# Altium footprint library aiskylab-01Resistors.PcbLib: 208 footprints (part 10 of 13)
Each footprint in its own frame and in the unit in brackets; x right, y up, seen from the top. Pads: shape width x height; smd on the part's side, far side on the other; paste and mask are expansions set on the pad; w line width, h text height; cw(c..) or ccw(c..) is an arc to the next point about the centre after c.
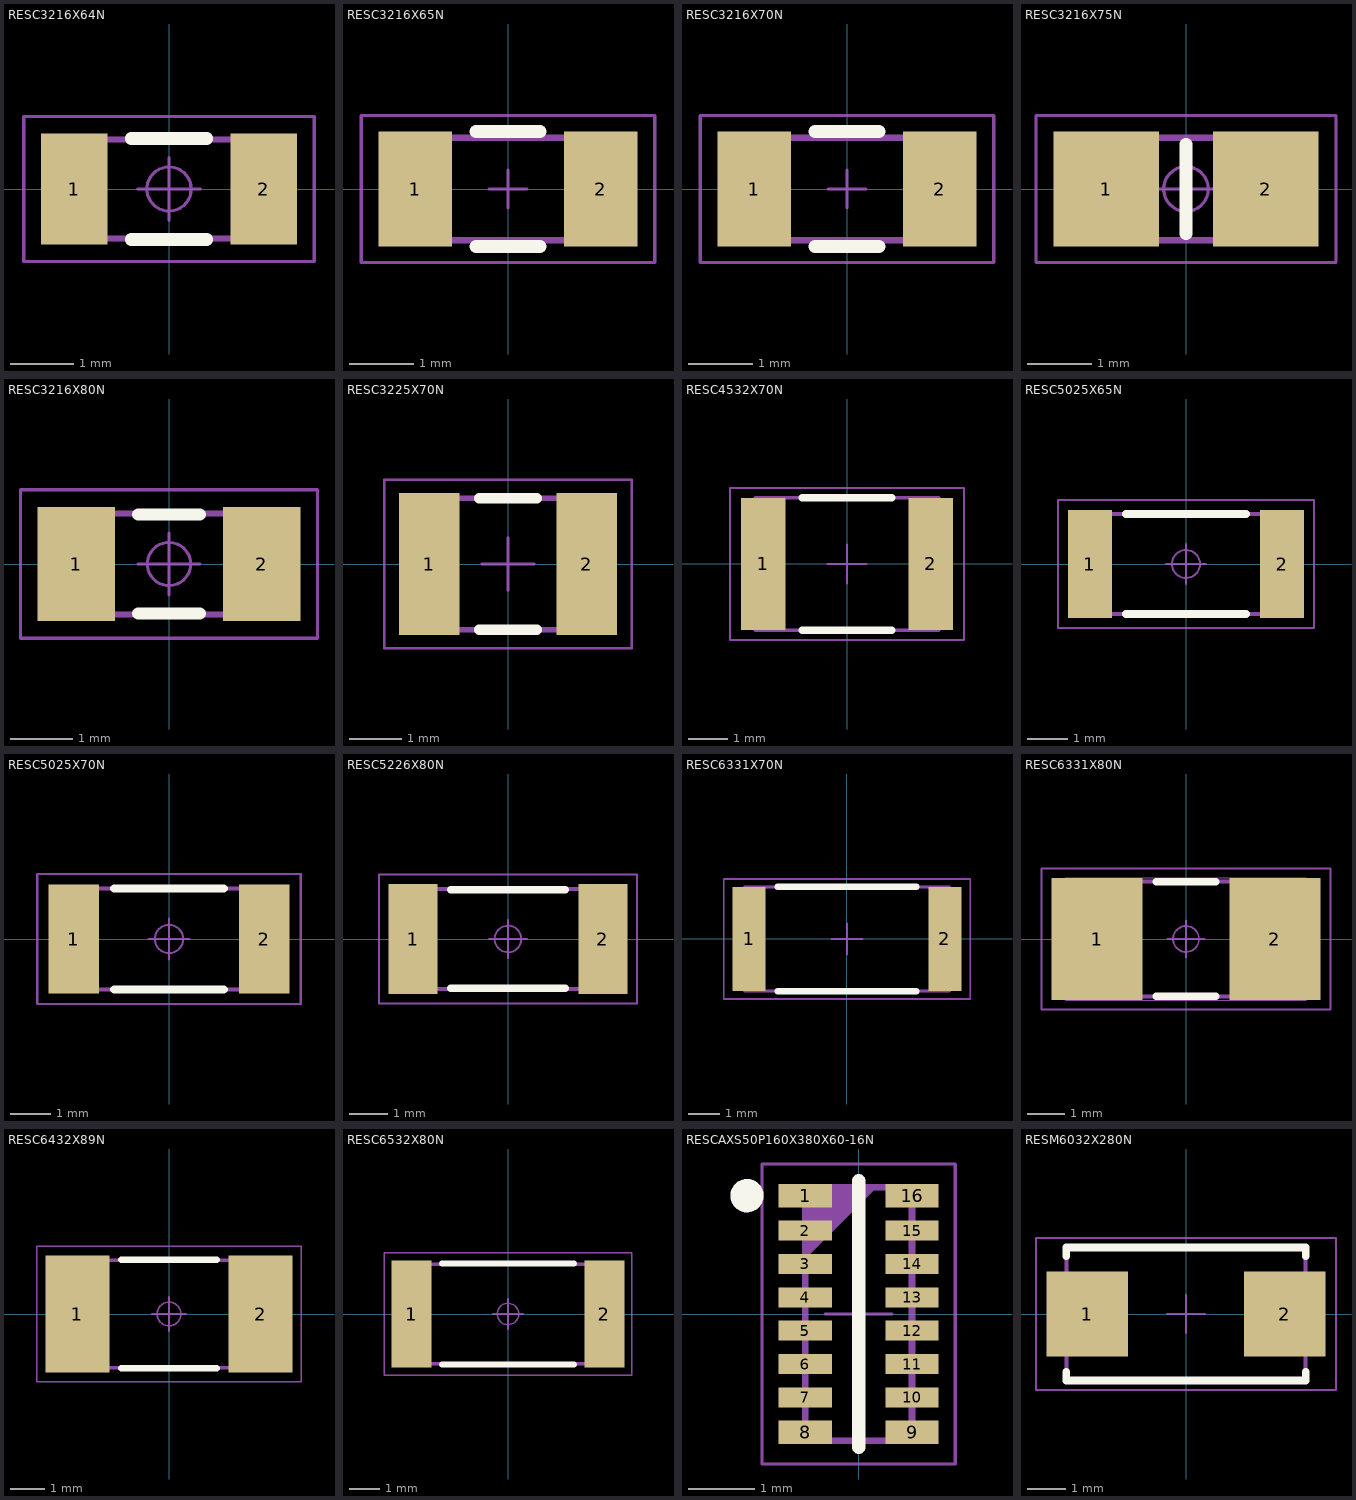
[diagram p9: the footprints below, top view; thin cyan lines are the x and y axes]

## RESC3216X64N [mm] "Chip Resistor, EIA 1206, Metric 3216, Body 3.2x1.6mm, IPC Medium Density"
height 0.64
pads (2):
  rect 1.05x1.75 smd: 1(-1.5,0) 2(1.5,0)
Top Overlay:
  lines w0.2: -0.6,-0.8 0.6,-0.8 ; -0.6,0.8 0.6,0.8
Top Designator:
  text ".Designator" at -7.618,-0.508 h1.52
Top Assembly:
  lines w0.1: -1.6,-0.785 -1.6,0.785 1.6,0.785 1.6,-0.785 -1.6,-0.785
Bottom 3D Body:
  circle w0.05: c0,0 r0.35
  lines w0.05: -0.5,0 0.5,0 ; 0,-0.5 0,0.5 ; -2.3,-1.15 -2.3,1.15 2.3,1.15 2.3,-1.15 -2.3,-1.15
3D body "p175-105.stp": height 0.02, standoff 0, extent -2.025,-0.875 -0.975,0.875
3D body "p175-105.stp": height 0.02, standoff 0, extent 0.975,-0.875 2.025,0.875
3D body "RESC3216X64N.stp": height 0.65, standoff 0, extent -1.675,-0.875 1.675,0.875

## RESC3216X65N [mm] "Chip Resistor, EIA 1206, Metric 3216, Body 3.2x1.6mm, IPC Medium Density"
height 0.65
pads (2):
  rect 1.15x1.8 smd: 1(-1.45,0) 2(1.45,0)
Top Overlay:
  lines w0.2: -0.5,-0.9 0.5,-0.9 ; -0.5,0.9 0.5,0.9
Top Designator:
  text ".Designator" at -7.618,-0.508 h1.52
Top Assembly:
  lines w0.1: -1.6,-0.8 -1.6,0.8 1.6,0.8 1.6,-0.8 -1.6,-0.8
Bottom 3D Body:
  lines w0.05: -0.3,0 0.3,0 ; 0,-0.3 0,0.3 ; -2.3,-1.15 -2.3,1.15 2.3,1.15 2.3,-1.15 -2.3,-1.15
3D body "p180-115.stp": height 0.02, standoff 0, extent -2.025,-0.9 -0.875,0.9
3D body "p180-115.stp": height 0.02, standoff 0, extent 0.875,-0.9 2.025,0.9
3D body "RESC3216X65N.stp": height 0.65, standoff 0, extent -1.675,-0.875 1.675,0.875

## RESC3216X70N [mm] "Chip Resistor, EIA 1206, Metric 3216, Body 3.2x1.6mm, IPC Medium Density"
height 0.7
pads (2):
  rect 1.15x1.8 smd: 1(-1.45,0) 2(1.45,0)
Top Overlay:
  lines w0.2: -0.5,-0.9 0.5,-0.9 ; -0.5,0.9 0.5,0.9
Top Designator:
  text ".Designator" at -7.618,-0.508 h1.52
Top Assembly:
  lines w0.1: -1.6,-0.8 -1.6,0.8 1.6,0.8 1.6,-0.8 -1.6,-0.8
Bottom 3D Body:
  lines w0.05: -0.3,0 0.3,0 ; 0,-0.3 0,0.3 ; -2.3,-1.15 -2.3,1.15 2.3,1.15 2.3,-1.15 -2.3,-1.15
3D body "p180-115.stp": height 0.02, standoff 0, extent -2.025,-0.9 -0.875,0.9
3D body "p180-115.stp": height 0.02, standoff 0, extent 0.875,-0.9 2.025,0.9
3D body "RESC3216X70N.stp": height 0.7, standoff 0, extent -1.7,-0.9 1.7,0.9

## RESC3216X75N [mm] "Chip Resistor, EIA 1206, Metric 3216, Body 3.2x1.6mm, IPC Medium Density"
height 0.75
pads (2):
  rect 1.65x1.8 smd: 1(-1.25,0) 2(1.25,0)
Top Overlay:
  lines w0.2: 0,-0.7 0,0.7
Top Designator:
  text ".Designator" at -7.618,-0.508 h1.52
Top Assembly:
  lines w0.1: -1.6,-0.8 -1.6,0.8 1.6,0.8 1.6,-0.8 -1.6,-0.8
Bottom 3D Body:
  circle w0.05: c0,0 r0.35
  lines w0.05: -0.5,0 0.5,0 ; 0,-0.5 0,0.5 ; -2.35,-1.15 -2.35,1.15 2.35,1.15 2.35,-1.15 -2.35,-1.15
3D body "p180-165.stp": height 0.02, standoff 0, extent 0.425,-0.9 2.075,0.9
3D body "p180-165.stp": height 0.02, standoff 0, extent -2.075,-0.9 -0.425,0.9
3D body "RESC3216X75N.stp": height 0.75, standoff 0, extent -1.675,-0.875 1.675,0.875

## RESC3216X80N [mm] "Chip Resistor, EIA 1206, Metric 3216, Body 3.2x1.6mm, IPC Medium Density"
height 0.8
pads (2):
  rect 1.25x1.85 smd: 1(-1.5,0) 2(1.5,0)
Top Overlay:
  lines w0.2: -0.5,-0.8 0.5,-0.8 ; -0.5,0.8 0.5,0.8
Top Designator:
  text ".Designator" at -7.618,-0.508 h1.52
Top Assembly:
  lines w0.1: -1.6,-0.815 -1.6,0.815 1.6,0.815 1.6,-0.815 -1.6,-0.815
Bottom 3D Body:
  circle w0.05: c0,0 r0.35
  lines w0.05: -0.5,0 0.5,0 ; 0,-0.5 0,0.5 ; -2.4,-1.2 2.4,-1.2 2.4,1.2 -2.4,1.2 -2.4,-1.2
3D body "p185-125.stp": height 0.02, standoff 0, extent 0.875,-0.925 2.125,0.925
3D body "p185-125.stp": height 0.02, standoff 0, extent -2.125,-0.925 -0.875,0.925
3D body "RESC3216X80N.stp": height 0.8, standoff 0, extent -1.675,-0.875 1.675,0.875

## RESC3225X70N [mm] "Chip Resistor, EIA 1210, Metric 3225, Body 3.2x2.5mm, IPC Medium Density"
height 0.7
pads (2):
  rect 1.15x2.7 smd: 1(-1.5,0) 2(1.5,0)
Top Overlay:
  lines w0.2: -0.55,-1.25 0.55,-1.25 ; -0.55,1.25 0.55,1.25
Top Designator:
  text ".Designator" at -7.618,-0.508 h1.52
Top Assembly:
  lines w0.1: -1.6,-1.25 -1.6,1.25 1.6,1.25 1.6,-1.25 -1.6,-1.25
Bottom 3D Body:
  lines w0.05: -0.5,0 0.5,0 ; 0,-0.5 0,0.5 ; -2.35,-1.6 -2.35,1.6 2.35,1.6 2.35,-1.6 -2.35,-1.6
3D body "p270-125.stp": height 0.02, standoff 0, extent 0.925,-1.35 2.075,1.35
3D body "p270-125.stp": height 0.02, standoff 0, extent -2.075,-1.35 -0.925,1.35
3D body "RESC3225X70N.stp": height 0.7, standoff 0, extent -1.7,-1.35 1.7,1.35

## RESC4532X70N [mm] "Chip Resistor, EIA 1812, Metric 4532, 2-Leads, Body 4.5x3.2mm, IPC Medium Density"
height 0.7
pads (2):
  rect 1.15x3.4 smd: 1(-2.15,0) 2(2.15,0)
Top Overlay:
  lines w0.2: -1.15,-1.7 1.15,-1.7 ; -1.15,1.7 1.15,1.7
Top Designator:
  text ".Designator" at -7.618,-0.508 h1.52
Top Assembly:
  lines w0.1: -2.35,-1.7 -2.35,1.7 2.35,1.7 2.35,-1.7 -2.35,-1.7
Bottom 3D Body:
  lines w0.05: -0.5,0 0.5,0 ; 0,-0.5 0,0.5 ; -3,-1.95 3,-1.95 3,1.95 -3,1.95 -3,-1.95
3D body "p340-115.stp": height 0.02, standoff 0, extent -2.725,-1.7 -1.575,1.7
3D body "p340-115.stp": height 0.02, standoff 0, extent 1.575,-1.7 2.725,1.7
3D body "RESC4532X70N.stp": height 0.7, standoff 0, extent -2.35,-1.7 2.35,1.7

## RESC5025X65N [mm] "Resistor, Chip; 5mm L X 2.5mm W X 0.65mm H, IPC Medium Density"
height 0.65
pads (2):
  rect 1.1x2.7 smd: 1(-2.4,0) 2(2.4,0)
Top Overlay:
  lines w0.2: -1.5,-1.25 1.5,-1.25 ; -1.5,1.25 1.5,1.25
Top Designator:
  text ".Designator" at -7.618,-0.508 h1.52
Top Assembly:
  lines w0.1: -2.5,-1.25 -2.5,1.25 2.5,1.25 2.5,-1.25 -2.5,-1.25
Bottom 3D Body:
  circle w0.05: c0,0 r0.35
  lines w0.05: -0.5,0 0.5,0 ; 0,-0.5 0,0.5 ; -3.2,-1.6 3.2,-1.6 3.2,1.6 -3.2,1.6 -3.2,-1.6
3D body "p270-110.stp": height 0.02, standoff 0, extent -2.95,-1.35 -1.85,1.35
3D body "p270-110.stp": height 0.02, standoff 0, extent 1.85,-1.35 2.95,1.35
3D body "RESC5025X65N.stp": height 0.65, standoff 0, extent -2.55,-1.325 2.55,1.325

## RESC5025X70N [mm] "Resistor, Chip; EIA 2010, Metric 5025, 5.00mm L X 2.50mm W X 0.70mm H, IPC Medium Density"
height 0.7
pads (2):
  rect 1.25x2.7 smd: 1(-2.35,0) 2(2.35,0)
Top Overlay:
  lines w0.2: -1.35,-1.25 1.35,-1.25 ; -1.35,1.25 1.35,1.25
Top Designator:
  text ".Designator" at -7.618,-0.508 h1.52
Top Assembly:
  lines w0.1: -2.5,-1.25 -2.5,1.25 2.5,1.25 2.5,-1.25 -2.5,-1.25
Bottom 3D Body:
  circle w0.05: c0,0 r0.35
  lines w0.05: -0.5,0 0.5,0 ; 0,-0.5 0,0.5 ; -3.25,-1.6 -3.25,1.6 3.25,1.6 3.25,-1.6 -3.25,-1.6
3D body "p270-125.stp": height 0.02, standoff 0, extent -2.975,-1.35 -1.725,1.35
3D body "p270-125.stp": height 0.02, standoff 0, extent 1.725,-1.35 2.975,1.35
3D body "RESC5025X70N.stp": height 0.7, standoff 0, extent -2.5,-1.25 2.5,1.25

## RESC5226X80N [mm] "Resistor, Chip; 5.23mm L X 2.64mm W X 0.80mm H IPC Medium Density"
height 0.8
pads (2):
  rect 1.3x2.9 smd: 1(-2.5,0) 2(2.5,0)
Top Overlay:
  lines w0.2: -1.5,-1.3 1.5,-1.3 ; -1.5,1.3 1.5,1.3
Top Designator:
  text ".Designator" at -7.618,-0.508 h1.52
Top Assembly:
  lines w0.1: -2.615,-1.32 -2.615,1.32 2.615,1.32 2.615,-1.32 -2.615,-1.32
Bottom 3D Body:
  circle w0.05: c0,0 r0.35
  lines w0.05: -0.5,0 0.5,0 ; 0,-0.5 0,0.5 ; -3.4,-1.7 3.4,-1.7 3.4,1.7 -3.4,1.7 -3.4,-1.7
3D body "p290-130.stp": height 0.02, standoff 0, extent -3.15,-1.45 -1.85,1.45
3D body "p290-130.stp": height 0.02, standoff 0, extent 1.85,-1.45 3.15,1.45
3D body "RESC5226X80N.stp": height 0.8, standoff 0, extent -2.615,-1.32 2.615,1.32

## RESC6331X70N [mm] "Chip Resistor, EIA 2512, Metric 6331, 2-Leads, Body 6.3x3.1mm, IPC Medium Density"
height 0.7
pads (2):
  rect 1.05x3.3 smd: 1(-3.1,0) 2(3.1,0)
Top Overlay:
  lines w0.2: -2.2,-1.65 2.2,-1.65 ; -2.2,1.65 2.2,1.65
Top Designator:
  text ".Designator" at -7.618,-0.508 h1.52
Top Assembly:
  lines w0.1: -3.25,-1.65 -3.25,1.65 3.25,1.65 3.25,-1.65 -3.25,-1.65
Bottom 3D Body:
  lines w0.05: -0.5,0 0.5,0 ; 0,-0.5 0,0.5 ; -3.9,-1.9 -3.9,1.9 3.9,1.9 3.9,-1.9 -3.9,-1.9
3D body "p330-105.stp": height 0.02, standoff 0, extent -3.625,-1.65 -2.575,1.65
3D body "p330-105.stp": height 0.02, standoff 0, extent 2.575,-1.65 3.625,1.65
3D body "RESC6331X70N.stp": height 0.7, standoff 0, extent -3.25,-1.65 3.25,1.65

## RESC6331X80N [mm] "Chip Resistor, EIA 2512, Metric 6331, 2-Leads, Body 6.3x3.1mm, IPC Medium Density"
height 0.8
pads (2):
  rect 2.45x3.3 smd: 1(-2.4,0) 2(2.4,0)
Top Overlay:
  lines w0.2: -0.8,-1.55 0.8,-1.55 ; -0.8,1.55 0.8,1.55
Top Designator:
  text ".Designator" at -7.618,-0.508 h1.52
Top Assembly:
  lines w0.1: -3.15,-1.55 -3.15,1.55 3.15,1.55 3.15,-1.55 -3.15,-1.55
Top 3D Body:
  lines w0.001: -3.25,-1.65 -3.25,1.65 3.25,1.65 3.25,-1.65 -3.25,-1.65
Bottom 3D Body:
  circle w0.05: c0,0 r0.35
  lines w0.05: -0.5,0 0.5,0 ; 0,-0.5 0,0.5 ; -3.9,-1.9 3.9,-1.9 3.9,1.9 -3.9,1.9 -3.9,-1.9
3D body "p330-245.stp": height 0.02, standoff 0, extent -3.625,-1.65 -1.175,1.65
3D body "p330-245.stp": height 0.02, standoff 0, extent 1.175,-1.65 3.625,1.65
3D body "RESC6331X80N.stp": height 0.8, standoff 0, extent -3.25,-1.65 3.25,1.65

## RESC6432X89N [mm] "Resistor, Chip; 6.35mm L X 3.18mm W X 0.889mm H, IPC Medium Density"
height 0.89
pads (2):
  rect 1.9x3.45 smd: 1(-2.7,0) 2(2.7,0)
Top Overlay:
  lines w0.2: -1.4,-1.6 1.4,-1.6 ; -1.4,1.6 1.4,1.6
Top Designator:
  text ".Designator" at -7.618,-0.508 h1.52
Top 3D Body:
  lines w0.1: -3.175,-1.59 -3.175,1.59 3.175,1.59 3.175,-1.59 -3.175,-1.59
Bottom 3D Body:
  circle w0.05: c0,0 r0.35
  lines w0.05: -0.5,0 0.5,0 ; 0,-0.5 0,0.5 ; -3.9,-2 3.9,-2 3.9,2 -3.9,2 -3.9,-2
3D body "p345-190.stp": height 0.02, standoff 0, extent -3.65,-1.725 -1.75,1.725
3D body "p345-190.stp": height 0.02, standoff 0, extent 1.75,-1.725 3.65,1.725
3D body "RESC6432X89N.stp": height 0.89, standoff 0, extent -3.3,-1.715 3.3,1.715

## RESC6532X80N [mm] "Resistor, Chip; 6.5mm L X 3.25mm W X 0.80mm H, IPC Medium Density"
height 0.8
pads (2):
  rect 1.3x3.5 smd: 1(-3.15,0) 2(3.15,0)
Top Overlay:
  lines w0.2: -2.15,-1.65 2.15,-1.65 ; -2.15,1.65 2.15,1.65
Top Designator:
  text ".Designator" at -7.618,-0.508 h1.52
Top Assembly:
  lines w0.1: -3.25,-1.625 -3.25,1.625 3.25,1.625 3.25,-1.625 -3.25,-1.625
Bottom 3D Body:
  circle w0.05: c0,0 r0.35
  lines w0.05: -0.5,0 0.5,0 ; 0,-0.5 0,0.5 ; -4.05,-2 -4.05,2 4.05,2 4.05,-2 -4.05,-2
3D body "p350-130.stp": height 0.02, standoff 0, extent -3.8,-1.75 -2.5,1.75
3D body "p350-130.stp": height 0.02, standoff 0, extent 2.5,-1.75 3.8,1.75
3D body "RESC6532X80N.stp": height 0.8, standoff 0, extent -3.25,-1.625 3.25,1.625

## RESCAXS50P160X380X60-16N [mm] "Resistor, Chip Array, 0.50mm pitch; 16 pin, 1.60mm W X 3.80mm L X 0.60mm H, IPC Medium Density"
height 0.6
pads (16):
  rect 0.8x0.35 smd: 1(-0.8,1.775) 8(-0.8,-1.775) 9(0.8,-1.775) 16(0.8,1.775)
  rect 0.8x0.3 smd: 2(-0.8,1.25) 3(-0.8,0.75) 4(-0.8,0.25) 5(-0.8,-0.25) 6(-0.8,-0.75) 7(-0.8,-1.25) 10(0.8,-1.25) 11(0.8,-0.75) 12(0.8,-0.25) 13(0.8,0.25) 14(0.8,0.75) 15(0.8,1.25)
Top Overlay:
  circle w0.25: c-1.675,1.775 r0.125
  lines w0.2: 0,-2 0,2
Top Designator:
  text ".Designator" at -7.843,-0.508 h1.52
Top Assembly:
  lines w0.1: -0.8,-1.9 -0.8,1.9 0.8,1.9 0.8,-1.9 -0.8,-1.9 ; -0.8,0.9 0.2,1.9 -0.8,0.9 ; -0.8,1 0.1,1.9 -0.8,1 ; -0.8,1.1 0,1.9 -0.8,1.1 ; -0.8,1.2 -0.1,1.9 -0.8,1.2 ; -0.8,1.3 -0.2,1.9 -0.8,1.3 ; -0.8,1.4 -0.3,1.9 -0.8,1.4 ; -0.8,1.5 -0.4,1.9 -0.8,1.5 ; -0.8,1.6 -0.5,1.9 -0.8,1.6 ; -0.8,1.7 -0.6,1.9 -0.8,1.7 ; -0.8,1.8 -0.7,1.9 -0.8,1.8
Bottom 3D Body:
  lines w0.05: -0.5,0 0.5,0 ; 0,-0.5 0,0.5 ; -1.45,-2.25 1.45,-2.25 1.45,2.25 -1.45,2.25 -1.45,-2.25
3D body "p080-030.stp": height 0.02, standoff 0, extent -1.2,-0.425 -0.4,-0.075
3D body "p080-030.stp": height 0.02, standoff 0, extent -1.2,-0.925 -0.4,-0.575
3D body "p080-030.stp": height 0.02, standoff 0, extent -1.2,-1.425 -0.4,-1.075
3D body "p080-030.stp": height 0.02, standoff 0, extent -1.2,-1.95 -0.4,-1.6
3D body "p080-030.stp": height 0.02, standoff 0, extent -1.2,1.6 -0.4,1.95
3D body "p080-030.stp": height 0.02, standoff 0, extent -1.2,1.075 -0.4,1.425
3D body "p080-030.stp": height 0.02, standoff 0, extent -1.2,0.575 -0.4,0.925
3D body "p080-030.stp": height 0.02, standoff 0, extent -1.2,0.075 -0.4,0.425
3D body "p080-030.stp": height 0.02, standoff 0, extent 0.4,-1.95 1.2,-1.6
3D body "p080-030.stp": height 0.02, standoff 0, extent 0.4,-1.425 1.2,-1.075
3D body "p080-030.stp": height 0.02, standoff 0, extent 0.4,-0.925 1.2,-0.575
3D body "p080-030.stp": height 0.02, standoff 0, extent 0.4,-0.425 1.2,-0.075
3D body "p080-030.stp": height 0.02, standoff 0, extent 0.4,0.075 1.2,0.425
3D body "p080-030.stp": height 0.02, standoff 0, extent 0.4,0.575 1.2,0.925
3D body "p080-030.stp": height 0.02, standoff 0, extent 0.4,1.075 1.2,1.425
3D body "p080-030.stp": height 0.02, standoff 0, extent 0.4,1.6 1.2,1.95
3D body "RESCAXS50P160X380X60-16N.stp": height 0.6, standoff 0, extent -0.9,-2 0.9,2

## RESM6032X280N [mm] "Molded Chip Resistor, 2-Leads, Body 6x3.2mm, IPC Medium Density"
height 2.8
pads (2):
  rect 2.15x2.25 smd: 1(-2.6,0) 2(2.6,0)
Top Overlay:
  lines w0.2: -3.15,-1.525 -3.15,-1.75 3.15,-1.75 3.15,-1.525 ; -3.15,1.525 -3.15,1.75 3.15,1.75 3.15,1.525
Top Designator:
  text ".Designator" at -7.618,-0.508 h1.52
Top Assembly:
  lines w0.1: -3.15,-1.75 -3.15,1.75 3.15,1.75 3.15,-1.75 -3.15,-1.75
Bottom 3D Body:
  lines w0.05: -0.5,0 0.5,0 ; 0,-0.5 0,0.5 ; -3.95,-2 -3.95,2 3.95,2 3.95,-2 -3.95,-2
3D body "p225-215.stp": height 0.02, standoff 0, extent -3.675,-1.125 -1.525,1.125
3D body "p225-215.stp": height 0.02, standoff 0, extent 1.525,-1.125 3.675,1.125
3D body "RESM6032X280N.stp": height 2.8, standoff 0, extent -3.15,-1.75 3.15,1.75